# Altium footprint library ic.PcbLib: 98 footprints (part 7 of 7)
Each footprint in its own frame and in the unit in brackets; x right, y up, seen from the top. Pads: shape width x height; smd on the part's side, far side on the other; paste and mask are expansions set on the pad; w line width, h text height; cw(c..) or ccw(c..) is an arc to the next point about the centre after c.
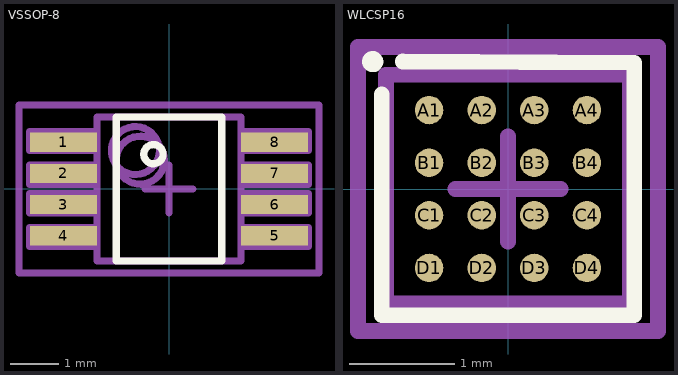
[diagram p6: the footprints below, top view; thin cyan lines are the x and y axes]

## VSSOP-8 [mm] "TSOP, 8-Leads, Body 3,00x3,00mm, Pitch 0,65mm, IPC Medium Density"
height 1.1
pads (8):
  rect 1.4x0.4 smd: 1(-2.2,0.975) 2(-2.2,0.325) 3(-2.2,-0.325) 4(-2.2,-0.975) 5(2.2,-0.975) 6(2.2,-0.325) 7(2.2,0.325) 8(2.2,0.975)
Top Overlay:
  circle w0.15: c-0.325,0.725 r0.2
  lines w0.15: -1.1,-1.5 -1.1,1.5 1.1,1.5 1.1,-1.5 -1.1,-1.5
  text "." at -2.2,1.7 h0.1
Mechanical 13:
  circle w0.15: c-0.6,0.6 r0.5
  lines w0.15: -1.5,-1.5 -1.5,1.5 1.5,1.5 1.5,-1.5 -1.5,-1.5
Top Courtyard:
  lines w0.15: -0.5,0 0.5,0 ; 0,-0.5 0,0.5 ; -3.125,-1.75 -3.125,1.75 3.125,1.75 3.125,-1.75 -3.125,-1.75
Mechanical 29:
  circle w0.15: c-0.7,0.8 r0.5
  lines w0.15: -1.5,-1.2 -2.9,-1.2 -2.9,-0.8 -1.5,-0.8 ; -1.5,-0.5 -2.9,-0.5 -2.9,-0.1 -1.5,-0.1 ; -1.5,0.1 -2.9,0.1 -2.9,0.5 -1.5,0.5 ; -1.5,0.8 -2.9,0.8 -2.9,1.2 -1.5,1.2 ; 1.5,-1.2 2.9,-1.2 2.9,-0.8 1.5,-0.8 ; 1.5,-0.5 2.9,-0.5 2.9,-0.1 1.5,-0.1 ; 1.5,0.1 2.9,0.1 2.9,0.5 1.5,0.5 ; 1.5,0.8 2.9,0.8 2.9,1.2 1.5,1.2 ; -1.5,-1.5 1.5,-1.5 1.5,1.5 -1.5,1.5 -1.5,-1.5
  text ".Designator" at -2.7,2 h1
3D body "VSSOP-8.step": height 1.1, standoff 0, extent -2.45,-1.5 2.45,1.5

## WLCSP16 [mm] "BGA, 16-Leads, Body 2,32x2,17mmx0,60mm, Pitch 0,50mm"
height 0.6
pads (16):
  round 0.27 smd: A1(-0.75,0.75) A2(-0.25,0.75) A3(0.25,0.75) A4(0.75,0.75) B1(-0.75,0.25) B2(-0.25,0.25) B3(0.25,0.25) B4(0.75,0.25) C1(-0.75,-0.25) C2(-0.25,-0.25) C3(0.25,-0.25) C4(0.75,-0.25) D1(-0.75,-0.75) D2(-0.25,-0.75) D3(0.25,-0.75) D4(0.75,-0.75)
Top Overlay:
  circle w0.1: c-1.285,1.21 r0.05
  lines w0.15: -1.2,0.9 -1.2,-1.2 1.2,-1.2 1.2,1.2 -1,1.21
Mechanical 13:
  lines w0.15: -1.16,-1.085 1.16,-1.085 1.16,1.085 -1.16,1.085 -1.16,-1.085
Top Courtyard:
  lines w0.15: -0.5,0 0.5,0 ; 0,-0.5 0,0.5 ; -1.425,-1.35 1.425,-1.35 1.425,1.35 -1.425,1.35 -1.425,-1.35
3D body "WLCSP16.step": height 0.6, standoff 0, extent -1.16,-1.085 1.16,1.085